# Altium footprint library discrete.PcbLib: 79 footprints (part 5 of 5)
Each footprint in its own frame and in the unit in brackets; x right, y up, seen from the top. Pads: shape width x height; smd on the part's side, far side on the other; paste and mask are expansions set on the pad; w line width, h text height; cw(c..) or ccw(c..) is an arc to the next point about the centre after c.
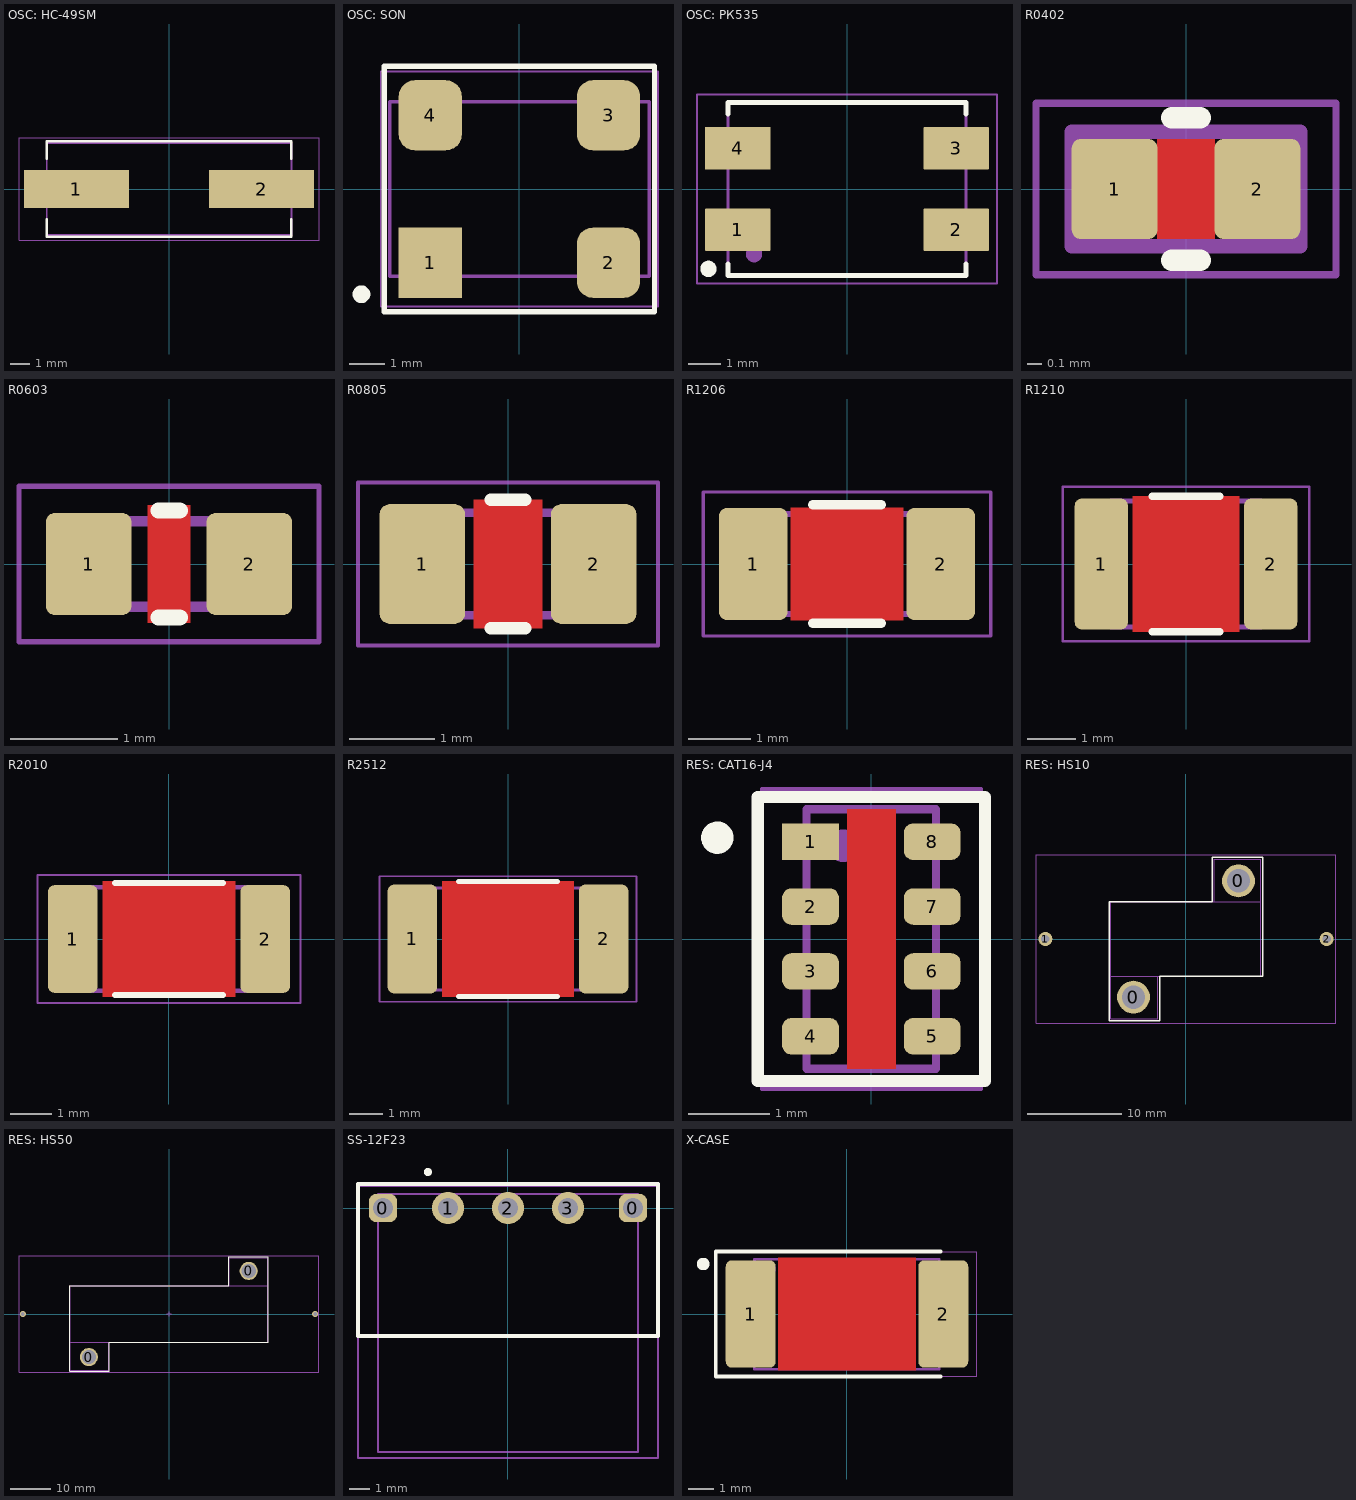
[diagram p4: the footprints below, top view; thin cyan lines are the x and y axes]

## OSC: HC-49SM [mm]
height 4.2
pads (2):
  rect 5.5x2 smd: 1(-4.85,0) 2(4.85,0)
Top Overlay:
  lines w0.15: -6.4,-1.6 -6.4,-2.5 6.4,-2.5 6.4,-1.6 ; -6.4,1.6 -6.4,2.5 6.4,2.5 6.4,1.6
Top Assy:
  lines w0.1: -6.4,-2.415 6.4,-2.415 6.4,2.415 -6.4,2.415 -6.4,-2.415
  text ".Designator" at -2.8,-0.408 h1.25
Top Cortyard:
  lines w0.05: -7.85,-2.675 -7.85,2.675 7.85,2.675 7.85,-2.675 -7.85,-2.675
3D body "User Library-Crystal HC49_US-SM.step": height 4.3, standoff 0, extent -6.4,-2.415 6.4,2.415

## OSC: SON [mm]
pads (4):
  rect 1.8x2 smd: 1(-2.54,-2.101)
  rrect50% 1.8x2 smd: 2(2.54,-2.101) 3(2.54,2.101) 4(-2.54,2.101)
Top Overlay:
  circle w0.3: c-4.5,-3 r0.1
  lines w0.15: -3.85,-3.5 3.85,-3.5 3.85,3.5 -3.85,3.5 -3.85,-3.5
Top Assy:
  circle w0.3: c-2.9,-1.9 r0.1
  lines w0.1: -3.7,-2.489 -3.7,2.489 3.7,2.489 3.7,-2.489 -3.7,-2.489
  text ".Designator" at -1.923,-0.356 h1
Top Cortyard:
  lines w0.05: -3.95,-3.35 3.95,-3.35 3.95,3.35 -3.95,3.35 -3.95,-3.35

## OSC: РК535 [mm] "Корпус для РК535, 4-Leads, Body 5.30x7.30x1.35mm"
height 1.35
pads (4):
  rrect5% 2x1.3 smd: 1(-3.35,-1.25) 2(3.35,-1.25) 3(3.35,1.25)
  rect 2x1.3 smd: 4(-3.35,1.25)
Top Overlay:
  circle w0.3: c-4.25,-2.45 r0.1
  lines w0.15: -3.65,-2.3 -3.65,-2.65 3.65,-2.65 3.65,-2.3 ; -3.65,2.3 -3.65,2.65 3.65,2.65 3.65,2.3
Top Assy:
  circle w0.3: c-2.85,-2 r0.1
  lines w0.1: -3.65,-2.65 -3.65,2.65 3.65,2.65 3.65,-2.65 -3.65,-2.65
  text ".Designator" at -1.425,-0.542 h1
Top Cortyard:
  lines w0.05: -4.6,-2.9 -4.6,2.9 4.6,2.9 4.6,-2.9 -4.6,-2.9

## R0402 [mm]
pads (2):
  rrect20% 0.6x0.7 smd: 1(-0.5,0) 2(0.5,0)
Top Layer:
  pour cut-out: 0.2,-0.35 0.2,0.35 -0.2,0.35 -0.2,-0.35
Top Overlay:
  lines w0.15: -0.1,-0.5 0.1,-0.5 ; -0.1,0.5 0.1,0.5
Top Assy:
  lines w0.1: -0.8,-0.4 -0.8,0.4 0.8,0.4 0.8,-0.4 -0.8,-0.4
  text ".Designator" at -0.626,-0.246 h0.5
Top Cortyard:
  lines w0.05: -1.05,-0.6 1.05,-0.6 1.05,0.6 -1.05,0.6 -1.05,-0.6

## R0603 [mm]
pads (2):
  rrect20% 0.8x0.95 smd: 1(-0.75,0) 2(0.75,0)
Top Layer:
  pour cut-out: 0.2,-0.55 0.2,0.55 -0.2,0.55 -0.2,-0.55
Top Overlay:
  lines w0.15: -0.1,-0.5 0.1,-0.5 ; -0.1,0.5 0.1,0.5
Top Assy:
  lines w0.1: -0.8,-0.4 0.8,-0.4 0.8,0.4 -0.8,0.4 -0.8,-0.4
  text ".Designator" at -0.678,-0.255 h0.5
Top Cortyard:
  lines w0.05: -1.4,-0.725 1.4,-0.725 1.4,0.725 -1.4,0.725 -1.4,-0.725
3D body "chip_0603_r.STEP": height 0.44, standoff -0.02, extent -0.8,-0.4 0.8,0.4

## R0805 [mm]
pads (2):
  rrect25% 1x1.4 smd: 1(-1,0) 2(1,0)
Top Layer:
  pour cut-out: 0.4,-0.75 0.4,0.75 -0.4,0.75 -0.4,-0.75
Top Overlay:
  lines w0.15: -0.2,-0.75 0.2,-0.75 ; -0.2,0.75 0.2,0.75
Top Assy:
  lines w0.1: -1,-0.6 1,-0.6 1,0.6 -1,0.6 -1,-0.6
  text ".Designator" at -0.774,-0.225 h0.5
Top Cortyard:
  lines w0.05: -1.75,-0.95 1.75,-0.95 1.75,0.95 -1.75,0.95 -1.75,-0.95
3D body "chip_0805_r.STEP": height 0.44, standoff -0.02, extent -1,-0.6 1,0.6

## R1206 [mm]
pads (2):
  rrect25% 1.1x1.8 smd: 1(-1.5,0) 2(1.5,0)
Top Layer:
  pour cut-out: 0.9,-0.9 0.9,0.9 -0.9,0.9 -0.9,-0.9
Top Overlay:
  lines w0.15: -0.55,-0.95 0.55,-0.95 ; -0.55,0.95 0.55,0.95
Top Assy:
  lines w0.1: -1.65,-0.8 -1.65,0.8 1.55,0.8 1.55,-0.8 -1.65,-0.8
  text ".Designator" at -1.375,-0.233 h0.5
Top Cortyard:
  lines w0.05: -2.3,-1.15 2.3,-1.15 2.3,1.15 -2.3,1.15 -2.3,-1.15
3D body "chip_1206_r.STEP": height 0.47, standoff -0.03, extent -1.65,-0.8 1.55,0.8

## R1210 [mm]
height 0.6
pads (2):
  rrect25% 1.1x2.7 smd: 1(-1.75,0) 2(1.75,0)
Top Layer:
  pour cut-out: -1.1,1.4 -1.1,-1.4 1.1,-1.4 1.1,1.4
Top Overlay:
  lines w0.15: -0.7,-1.4 0.7,-1.4 ; -0.7,1.4 0.7,1.4
Top Assy:
  lines w0.1: -1.55,-1.3 1.55,-1.3 1.55,1.3 -1.55,1.3 -1.55,-1.3
  text ".Designator" at -0.85,-0.208 h0.5
Top Cortyard:
  lines w0.05: -2.55,-1.6 -2.55,1.6 2.55,1.6 2.55,-1.6 -2.55,-1.6
3D body: height 0.6, standoff 0, extent -1.55,-1.3 1.55,1.3

## R2010 [mm]
height 0.65
pads (2):
  rrect25% 1.2x2.6 smd: 1(-2.325,0) 2(2.325,0)
Top Layer:
  pour cut-out: 1.6,-1.4 1.6,1.4 -1.6,1.4 -1.6,-1.4
Top Overlay:
  lines w0.15: -1.3,-1.35 1.3,-1.35 ; -1.3,1.35 1.3,1.35
Top Assy:
  lines w0.1: -2.5,-1.25 -2.5,1.25 2.5,1.25 2.5,-1.25 -2.5,-1.25
  text ".Designator" at -1.45,-0.158 h0.5
Top Cortyard:
  lines w0.05: -3.175,-1.55 3.175,-1.55 3.175,1.55 -3.175,1.55 -3.175,-1.55
3D body: height 0.65, standoff 0, extent -2.5,-1.25 2.5,1.25

## R2512 [mm]
pads (2):
  rrect25% 1.5x3.3 smd: 1(-2.9,0) 2(2.9,0)
Top Layer:
  pour cut-out: 2,-1.75 2,1.75 -2,1.75 -2,-1.75
Top Overlay:
  lines w0.15: -1.5,-1.75 1.5,-1.75 ; -1.5,1.75 1.5,1.75
Top Assy:
  lines w0.1: -3.17,-1.55 3.18,-1.55 3.18,1.55 -3.17,1.55 -3.17,-1.55
  text ".Designator" at -1.1,-0.208 h0.5
Top Cortyard:
  lines w0.05: -3.9,-1.9 3.9,-1.9 3.9,1.9 -3.9,1.9 -3.9,-1.9
3D body "User Library-R_2512.step": height 0.6, standoff 0, extent -3.2,-1.6 3.2,1.6

## RES: CAT16-J4 [mm]
pads (8):
  rect 0.7x0.45 smd: 1(-0.75,1.2)
  rrect50% 0.7x0.45 smd: 2(-0.75,0.4) 3(-0.75,-0.4) 4(-0.75,-1.2) 5(0.75,-1.2) 6(0.75,-0.4) 7(0.75,0.4) 8(0.75,1.2)
Top Layer:
  pour cut-out: -0.3,1.6 -0.3,-1.6 0.3,-1.6 0.3,1.6
Top Overlay:
  circle w0.2: c-1.9,1.25 r0.1
  lines w0.15: -1.4,-1.75 1.4,-1.75 1.4,1.75 -1.4,1.75 -1.4,-1.75
Top Assy:
  circle w0.2: c-0.35,1.15 r0.1
  lines w0.1: -0.8,-1.6 0.8,-1.6 0.8,1.6 -0.8,1.6 -0.8,-1.6
  text ".Designator" at 0.475,-1.275 h0.75
Top Cortyard:
  lines w0.05: -1.35,-1.85 1.35,-1.85 1.35,1.85 -1.35,1.85 -1.35,-1.85
3D body "User Library-Array-1206-4Way-Var1.STEP": height 0.5, standoff 0, extent -0.8,-1.6 0.8,1.6

## RES: HS10 [mm]
pads (4):
  round 3.5 hole 2.5: 0(-5.6,-6.2) 0(5.6,6.2)
  round 1.5 hole 0.9: 1(-15,0) 2(15,0)
Top Overlay:
  lines w0.15: -2.8,-4 8.2,-4 8.2,8.7 2.8,8.7 2.8,4 -8.2,4 -8.2,-8.7 -2.8,-8.7 -2.8,-4 ; -2.8,-4 -2.8,-4
Top Assy:
  lines w0.1: -8,-4 8,-4 8,8.5 3,8.5 3,4 ; -3,-4 -3,-8.5 -8,-8.5 -8,4 8,4
  text ".Designator" at -2.65,-0.8 h1.5
Top Cortyard:
  lines w0.05: -16,-9 -16,9 16,9 16,-9 -16,-9

## RES: HS50 [mm]
pads (4):
  round 4.5 hole 3.5: 0(-19.9,-10.7) 0(19.8,10.7)
  round 1.5 hole 0.9: 1(-36.3,0) 2(36.3,0)
Top Overlay:
  lines w0.15: -14.8,-7 24.7,-7 24.7,14.2 14.8,14.2 14.8,7 -24.7,7 -24.7,-14.2 -14.8,-14.2 -14.8,-7 ; -14.8,-7 -14.8,-7
Top Assy:
  lines w0.1: -24.5,-7 24.5,-7 24.5,14 15,14 15,7 ; -15,-7 -15,-14 -24.5,-14 -24.5,7 24.5,7
  text ".Designator" at -10.35,-2.259 h5
Top Cortyard:
  lines w0.05: -0.5,0 0.5,0 ; 0,-0.5 0,0.5 ; -37.25,-14.5 37.25,-14.5 37.25,14.5 -37.25,14.5 -37.25,-14.5

## SS-12F23 [mm] "Switch"
height 0.9
pads (5):
  rrect50% 1.4x1.4 hole 1: 0(-6.25,0) 0(6.25,0)
  round 1.6 hole 1: 1(-3,0) 2(0,0) 3(3,0)
Top Overlay:
  circle w0.2: c-4,1.8 r0.1
  lines w0.2: -7.5,-6.4 7.5,-6.4 7.5,1.2 -7.5,1.2 -7.5,-6.4
Top Assy:
  lines w0.1: -6.5,-12.2 6.5,-12.2 6.5,0.7 -6.5,0.7 -6.5,-12.2
  text ".Designator" at -2.6,-3.6 h1.5
Top Cortyard:
  lines w0.1: -7.5,-12.5 -7.5,1.1 7.5,1.1 7.5,-12.5 -7.5,-12.5
3D body "User Library-SLIDE SWITCH SS12F23.STEP": height 6.25, standoff -2.85, extent -6.517,-12.225 6.483,0.675

## X-CASE [mm]
height 4
pads (2):
  rrect25% 2x4.3 smd: 1(-3.85,0) 2(3.85,0)
Top Layer:
  pour cut-out: -2.75,2.25 -2.75,-2.25 2.75,-2.25 2.75,2.25
Top Overlay:
  circle w0.3: c-5.75,2 r0.1
  lines w0.15: 3.75,-2.5 -5.25,-2.5 -5.25,2.5 3.75,2.5
Top Assy:
  circle w0.3: c-3.1,1.8 r0.1
  lines w0.1: -3.7,-2.2 -3.7,2.2 3.7,2.2 3.7,-2.2 -3.7,-2.2
  text ".Designator" at -1.825,-0.275 h0.75
Top Cortyard:
  lines w0.05: -5.2,-2.5 -5.2,2.5 5.2,2.5 5.2,-2.5 -5.2,-2.5
3D body "User Library-AVX_D_CASE.STEP": height 3.01, standoff 0, extent -3.7,-2.225 3.7,2.225